# Altium footprint library Mechanical.PcbLib: 125 footprints (part 3 of 8)
Each footprint in its own frame and in the unit in brackets; x right, y up, seen from the top. Pads: shape width x height; smd on the part's side, far side on the other; paste and mask are expansions set on the pad; w line width, h text height; cw(c..) or ccw(c..) is an arc to the next point about the centre after c.
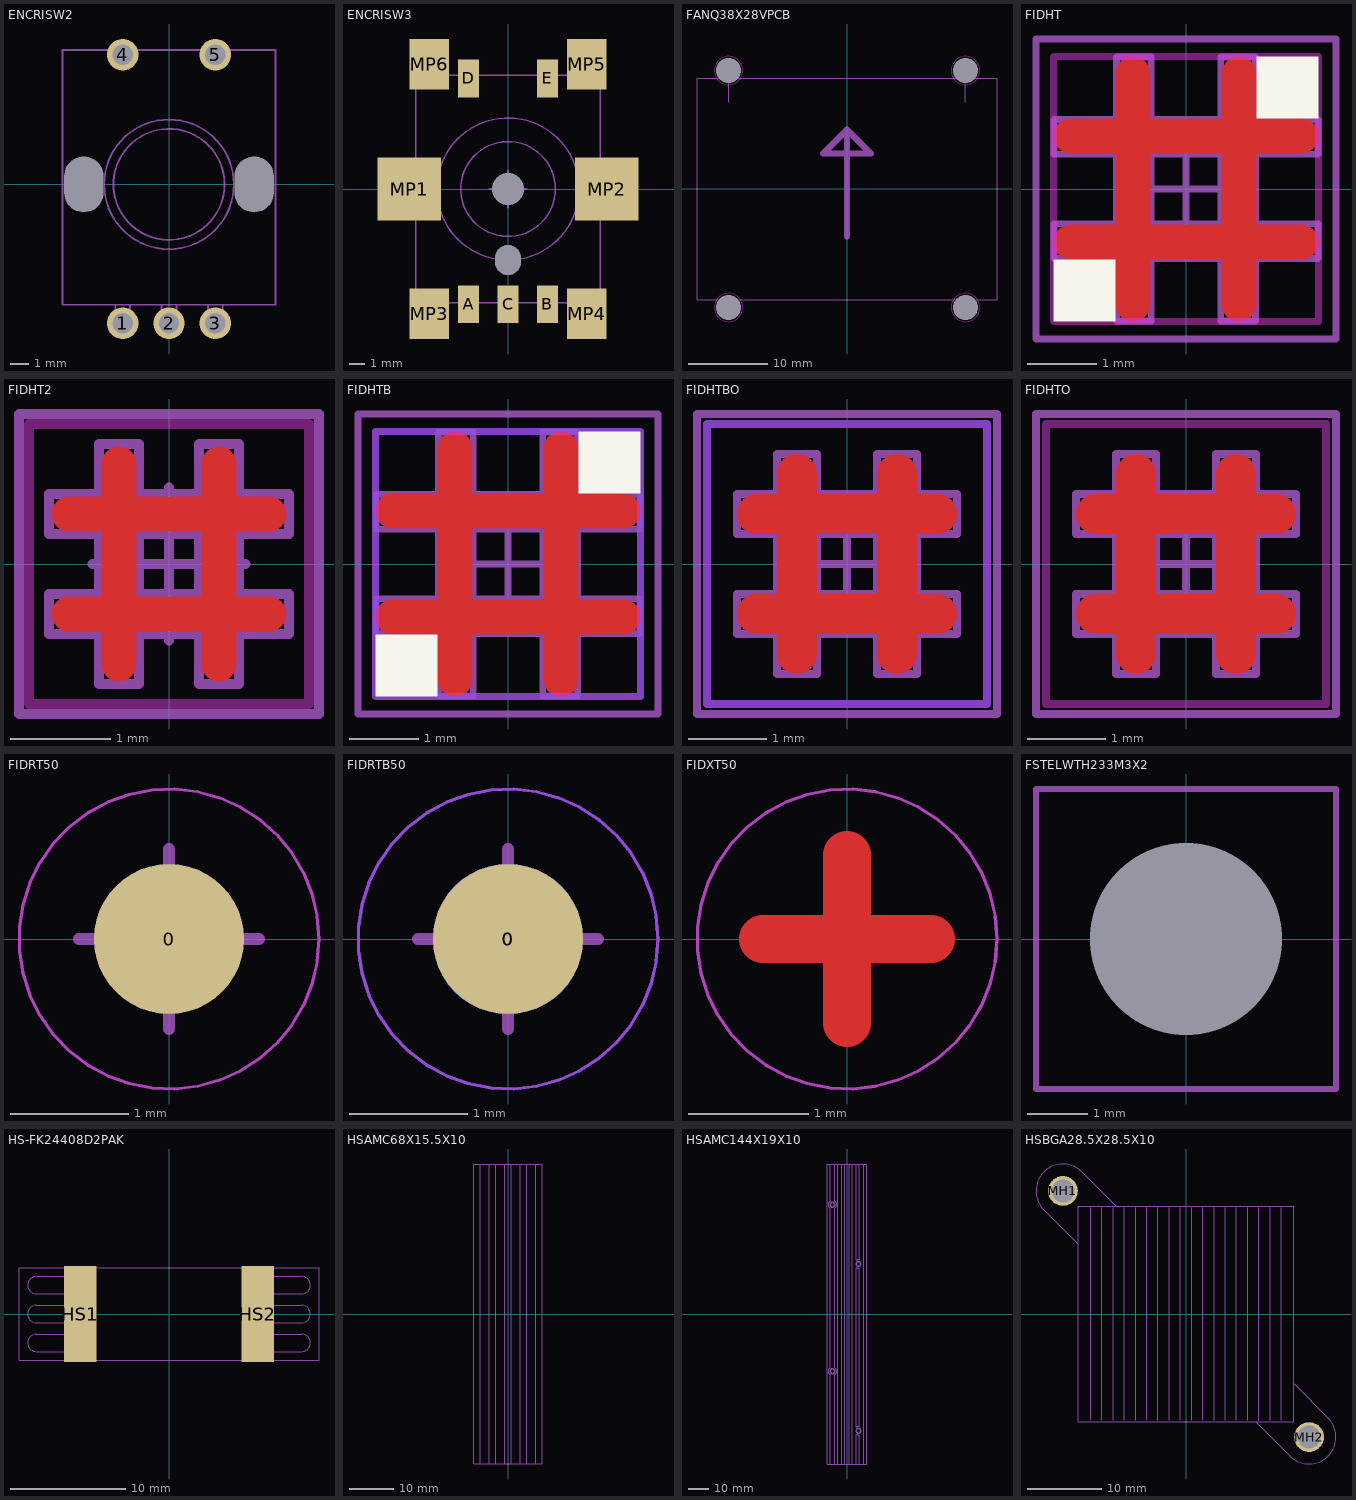
[diagram p2: the footprints below, top view; thin cyan lines are the x and y axes]

## ENCRISW2 [mm] "Incermental Encoder Type E27"
height 26
pads (7):
  round 1.7 hole 1.1: 1(-2.5,-7.5) 2(0,-7.5) 3(2.5,-7.5) 4(-2.5,7) 5(2.5,7)
  rrect50% 0x0 hole 2.1 slot 3 at 90 deg unplated: MH1(-4.6,0) MH2(4.6,0)
Mechanical 13:
  circle w0.1: c0,0 r3
  circle w0.1: c0,0 r3.5
  lines w0.1: -2.9,-6.5 -2.9,-7.5 -2.1,-7.5 -2.1,-6.5 ; -0.4,-6.5 -0.4,-7.5 0.4,-7.5 0.4,-6.5 ; 2.1,-6.5 2.1,-7.5 2.9,-7.5 2.9,-6.5 ; -5.75,-6.5 -5.75,7.25 5.725,7.25 5.75,7.25 5.75,-6.5 -5.75,-6.5
3D body: height 4, standoff 3, extent 2,-8 3,-6.5
3D body: height 4, standoff 3, extent -0.5,-8 0.5,-6.5
3D body: height 4, standoff 3, extent -3,-8 -2,-6.5
3D body: height 3, standoff -3.3, extent 2.1,6.6 2.9,7.3
3D body: height 3, standoff -3.3, extent -2.9,6.6 -2.1,7.3
3D body: height 3, standoff -3.3, extent 2.1,-7.9 2.9,-7.2
3D body: height 3, standoff -3.3, extent -0.4,-7.9 0.4,-7.2
3D body: height 3, standoff -3.3, extent -2.9,-7.9 -2.1,-7.2
3D body: height 26, standoff 10, extent -3,-3 3,3
3D body: height 10, standoff 6.3, extent -3.5,-3.5 3.5,3.5
3D body: height 6.5, standoff 0, extent -5.75,-6.5 5.725,7.25

## ENCRISW3 [mm] "Alps EC11J1524801 smd"
height 24.5
pads (13):
  rect 1.35x2.4 smd: A(-2.5,-7.3) B(2.5,-7.3) C(0,-7.3) D(-2.5,7) E(2.5,7)
  rrect50% 0x0 hole 2.05 unplated: MH1(0,0)
  rrect50% 0x0 hole 1.6 slot 1.9 at 90 deg unplated: MH2(0,-4.5)
  rect 4x4 smd: MP1(-6.25,0) MP2(6.25,0)
  rect 2.5x3.2 smd: MP3(-5,-7.9) MP4(5,-7.9) MP5(5,7.9) MP6(-5,7.9)
Mechanical 13:
  circle w0.1: c0,0 r3
  circle w0.1: c0,0 r4.5
  lines w0.1: -5.85,-1.525 -5.875,-1.5 -7.5,-1.5 -7.5,1.5 -5.85,1.5 ; -4.05,-7.2 -4.05,-9 -5.85,-9 -5.85,-7.2 ; -4.05,7.2 -4.05,9 -5.85,9 -5.85,7.2 ; 4.05,-7.2 4.05,-9 5.85,-9 5.85,-7.2 ; 4.05,7.2 4.05,9 5.85,9 5.85,7.2 ; 5.85,-1.525 5.875,-1.5 7.5,-1.5 7.5,1.5 5.85,1.5 ; -5.85,-7.2 -5.85,7.2 ; -5.85,-7.2 5.85,-7.2 ; -5.85,7.2 5.85,7.2 ; 5.85,-7.2 5.85,7.2
Mechanical 15:
  lines w0.1: -1.2,0 1.2,0 ; 0,-1.2 0,1.2
3D body: height 24.5, standoff 14.5, extent -3,-3 3,1.5
3D body: height 14.5, standoff 11.5, extent -3,-3 2.976,2.988
3D body: height 11.5, standoff 10, extent -3.5,-3.5 3.472,3.486
3D body: height 10, standoff 4.5, extent -4.5,-4.5 4.465,4.482
3D body: height 4.5, standoff 0.2, extent -5.85,-7.2 5.85,7.2
3D body: height 0.2, standoff 0, extent -7.5,-9 7.5,9

## FANQ38X28VPCB [mm] "FAN 38x38x28mm vertical mounted on pcb"
height 38
pads (4):
  round 0 hole 3.2 unplated mask+2: MH1(15,15) MH2(-15,15) MH3(-15,-15) MH4(15,-15)
Keep-Out Layer:
  circle w0.127: c15,15 r1.8
  circle w0.127: c15,-15 r1.8
  circle w0.127: c-15,-15 r1.8
  circle w0.127: c-15,15 r1.8
Mechanical 13:
  lines w0.127: -15,11 -15,14 ; 15,11 15,14 ; -19,-14 -19,14 19,14 19,-14 -19,-14
  lines w0.813: 0,-6 0,7.5 ; 0,7.5 3,4.5 -3,4.5 0,7.5
  text "FAN 38x38x28mm" at -12,-10 h3.17
3D body: height 38, standoff 36, extent -19,-14 19,14
3D body: height 2, standoff 0, extent -19,-14 19,14
3D body: height 36, standoff 2, extent 17,-14 19,14
3D body: height 36, standoff 2, extent -19,-14 -17,14

## FIDHT [mm] "Fiducial TOP hash"
Top Layer:
  lines w0.508: -1.651,-0.762 1.651,-0.762 ; -1.651,0.762 1.651,0.762 ; -0.762,-1.651 -0.762,1.651 ; 0.762,-1.651 0.762,1.651
Top Layer keep-out:
  lines w0.102: -1.905,-1.905 -1.905,1.905 1.905,1.905 1.905,-1.905 -1.905,-1.905
Top Overlay:
  rectangle: 1.016,1.016 1.905,1.905
  rectangle: -1.905,-1.905 -1.016,-1.016
Top Solder:
  rectangle: 1.016,-1.905 1.905,-1.016
  rectangle: -1.905,1.016 -1.016,1.905
Mechanical 13:
  lines w0.1: -1.9,-1 -1.9,-0.5 -1,-0.5 -1,0.5 -1.9,0.5 -1.9,1 -1,1 -1,1.9 -0.5,1.9 -0.5,1 0.5,1 0.5,1.9 1,1.9 1,1 1.9,1 1.9,0.5 1,0.5 1,-0.5 1.9,-0.5 1.9,-1 1,-1 1,-1.9 0.5,-1.9 0.5,-1 -0.5,-1 -0.5,-1.9 -1,-1.9 -1,-1 -1.9,-1 ; -0.5,-0.5 -0.5,0.5 0.5,0.5 0.5,-0.5 -0.5,-0.5
Mechanical 15:
  lines w0.102: -0.762,0 0.762,0 ; 0,-0.762 0,0.762 ; -2.159,-2.159 2.159,-2.159 2.159,2.159 -2.159,2.159 -2.159,-2.159

## FIDHT2 [mm] "Fiducial TOP hash open mask small"
Top Layer:
  lines w0.35: -1,-0.5 1,-0.5 ; -1,0.5 1,0.5 ; -0.5,-1 -0.5,1 ; 0.5,-1 0.5,1
Top Layer keep-out:
  lines w0.102: -1.4,-1.4 -1.4,1.4 1.4,1.4 1.4,-1.4 -1.4,-1.4
Mechanical 13:
  lines w0.1: -1.2,-0.7 -1.2,-0.3 -0.7,-0.3 -0.7,0.3 -1.2,0.3 -1.2,0.7 -0.7,0.7 -0.7,1.2 -0.3,1.2 -0.3,0.7 0.3,0.7 0.3,1.2 0.7,1.2 0.7,0.7 1.2,0.7 1.2,0.3 0.7,0.3 0.7,-0.3 1.2,-0.3 1.2,-0.7 0.7,-0.7 0.7,-1.2 0.3,-1.2 0.3,-0.7 -0.3,-0.7 -0.3,-1.2 -0.7,-1.2 -0.7,-0.7 -1.2,-0.7 ; -0.3,-0.3 -0.3,0.3 0.3,0.3 0.3,-0.3 -0.3,-0.3
Mechanical 15:
  lines w0.102: -0.762,0 0.762,0 ; 0,-0.762 0,0.762 ; -1.5,-1.5 1.5,-1.5 1.5,1.5 -1.5,1.5 -1.5,-1.5

## FIDHTB [mm] "Fiducial TOP & BOTTOM hash"
Top Layer:
  lines w0.508: -1.651,-0.762 1.651,-0.762 ; -1.651,0.762 1.651,0.762 ; -0.762,-1.651 -0.762,1.651 ; 0.762,-1.651 0.762,1.651
Top Layer keep-out:
  lines w0.102: -1.905,-1.905 1.905,-1.905 1.905,1.905 -1.905,1.905 -1.905,-1.905
Bottom Layer:
  lines w0.508: -1.651,-0.762 1.651,-0.762 ; -1.651,0.762 1.651,0.762 ; -0.762,-1.651 -0.762,1.651 ; 0.762,-1.651 0.762,1.651
Bottom Layer keep-out:
  lines w0.102: -1.905,-1.905 1.905,-1.905 1.905,1.905 -1.905,1.905 -1.905,-1.905
Top Overlay:
  rectangle: -1.905,-1.905 -1.016,-1.016
  rectangle: 1.016,1.016 1.905,1.905
Bottom Overlay:
  rectangle: -1.905,-1.905 -1.016,-1.016
  rectangle: 1.016,1.016 1.905,1.905
Top Solder:
  rectangle: -2.159,-2.159 2.159,2.159
Bottom Solder:
  rectangle: -2.159,-2.159 2.159,2.159
Mechanical 13:
  lines w0.1: -1.9,-1 -1,-1 -1,-1.9 -0.5,-1.9 -0.5,-1 0.5,-1 0.5,-1.9 1,-1.9 1,-1 1.9,-1 1.9,-0.5 1,-0.5 1,0.5 1.9,0.5 1.9,1 1,1 1,1.9 0.5,1.9 0.5,1 -0.5,1 -0.5,1.9 -1,1.9 -1,1 -1.9,1 -1.9,0.5 -1,0.5 -1,-0.5 -1.9,-0.5 -1.9,-1 ; -0.5,-0.5 0.5,-0.5 0.5,0.5 -0.5,0.5 -0.5,-0.5
Mechanical 14:
  lines w0.1: -1.9,-1 -1,-1 -1,-1.9 -0.5,-1.9 -0.5,-1 0.5,-1 0.5,-1.9 1,-1.9 1,-1 1.9,-1 1.9,-0.5 1,-0.5 1,0.5 1.9,0.5 1.9,1 1,1 1,1.9 0.5,1.9 0.5,1 -0.5,1 -0.5,1.9 -1,1.9 -1,1 -1.9,1 -1.9,0.5 -1,0.5 -1,-0.5 -1.9,-0.5 -1.9,-1 ; -0.5,-0.5 0.5,-0.5 0.5,0.5 -0.5,0.5 -0.5,-0.5
Mechanical 15:
  lines w0.102: -0.762,0 0.762,0 ; 0,-0.762 0,0.762 ; -2.159,-2.159 -2.159,2.159 2.159,2.159 2.159,-2.159 -2.159,-2.159
Mechanical 16:
  lines w0.102: -2.159,-2.159 -2.159,2.159 2.159,2.159 2.159,-2.159 -2.159,-2.159

## FIDHTBO [mm] "Fiducial TOP & BOTTOM hash open mask"
Top Layer:
  lines w0.508: -1.143,-0.635 1.143,-0.635 ; -1.143,0.635 1.143,0.635 ; -0.635,-1.143 -0.635,1.143 ; 0.635,-1.143 0.635,1.143
Top Layer keep-out:
  lines w0.102: -1.778,-1.778 -1.778,1.778 1.778,1.778 1.778,-1.778 -1.778,-1.778
Bottom Layer:
  lines w0.508: -1.143,-0.635 1.143,-0.635 ; -1.143,0.635 1.143,0.635 ; -0.635,-1.143 -0.635,1.143 ; 0.635,-1.143 0.635,1.143
Bottom Layer keep-out:
  lines w0.102: -1.778,-1.778 -1.778,1.778 1.778,1.778 1.778,-1.778 -1.778,-1.778
Top Solder:
  rectangle: -1.905,-1.905 1.905,1.905
Bottom Solder:
  rectangle: -1.905,-1.905 1.905,1.905
Mechanical 13:
  lines w0.1: -1.397,-0.889 -1.397,-0.381 -0.889,-0.381 -0.889,0.381 -1.397,0.381 -1.397,0.889 -0.889,0.889 -0.889,1.397 -0.381,1.397 -0.381,0.889 0.381,0.889 0.381,1.397 0.889,1.397 0.889,0.889 1.397,0.889 1.397,0.381 0.889,0.381 0.889,-0.381 1.397,-0.381 1.397,-0.889 0.889,-0.889 0.889,-1.397 0.381,-1.397 0.381,-0.889 -0.381,-0.889 -0.381,-1.397 -0.889,-1.397 -0.889,-0.889 -1.397,-0.889 ; -0.381,-0.381 -0.381,0.381 0.381,0.381 0.381,-0.381 -0.381,-0.381
Mechanical 14:
  lines w0.1: -1.397,-0.889 -1.397,-0.381 -0.889,-0.381 -0.889,0.381 -1.397,0.381 -1.397,0.889 -0.889,0.889 -0.889,1.397 -0.381,1.397 -0.381,0.889 0.381,0.889 0.381,1.397 0.889,1.397 0.889,0.889 1.397,0.889 1.397,0.381 0.889,0.381 0.889,-0.381 1.397,-0.381 1.397,-0.889 0.889,-0.889 0.889,-1.397 0.381,-1.397 0.381,-0.889 -0.381,-0.889 -0.381,-1.397 -0.889,-1.397 -0.889,-0.889 -1.397,-0.889 ; -0.381,-0.381 -0.381,0.381 0.381,0.381 0.381,-0.381 -0.381,-0.381
Mechanical 15:
  lines w0.102: -0.762,0 0.762,0 ; 0,-0.762 0,0.762 ; -1.905,-1.905 1.905,-1.905 1.905,1.905 -1.905,1.905 -1.905,-1.905

## FIDHTO [mm] "Fiducial TOP hash open mask"
Top Layer:
  lines w0.508: -1.143,-0.635 1.143,-0.635 ; -1.143,0.635 1.143,0.635 ; -0.635,-1.143 -0.635,1.143 ; 0.635,-1.143 0.635,1.143
Top Layer keep-out:
  lines w0.102: -1.778,-1.778 1.778,-1.778 1.778,1.778 -1.778,1.778 -1.778,-1.778
Top Solder:
  rectangle: -1.905,-1.905 1.905,1.905
Mechanical 13:
  lines w0.1: -1.397,-0.889 -0.889,-0.889 -0.889,-1.397 -0.381,-1.397 -0.381,-0.889 0.381,-0.889 0.381,-1.397 0.889,-1.397 0.889,-0.889 1.397,-0.889 1.397,-0.381 0.889,-0.381 0.889,0.381 1.397,0.381 1.397,0.889 0.889,0.889 0.889,1.397 0.381,1.397 0.381,0.889 -0.381,0.889 -0.381,1.397 -0.889,1.397 -0.889,0.889 -1.397,0.889 -1.397,0.381 -0.889,0.381 -0.889,-0.381 -1.397,-0.381 -1.397,-0.889 ; -0.381,-0.381 0.381,-0.381 0.381,0.381 -0.381,0.381 -0.381,-0.381
Mechanical 15:
  lines w0.102: -0.762,0 0.762,0 ; 0,-0.762 0,0.762 ; -1.905,-1.905 -1.905,1.905 1.905,1.905 1.905,-1.905 -1.905,-1.905

## FIDRT50 [mm] "Fiducial TOP round 50mil"
pads (1):
  round 1.27 smd paste-2.54 mask+0.635: 0(0,0)
Top Layer keep-out:
  circle w0.025: c0,0 r1.27
Mechanical 13:
  circle w0.025: c0,0 r1.27
Mechanical 15:
  lines w0.102: -0.762,0 0.762,0 ; 0,-0.762 0,0.762

## FIDRTB50 [mm] "Fiducial Top & Bottom round 50mil"
pads (2):
  round 1.27 smd paste-2.54 mask+0.635: 0(0,0)
  round 1.27 smd far side paste-2.54 mask+0.635: 0(0,0)
Top Layer keep-out:
  circle w0.025: c0,0 r1.27
Bottom Layer keep-out:
  circle w0.025: c0,0 r1.27
Mechanical 13:
  circle w0.025: c0,0 r1.27
Mechanical 14:
  circle w0.025: c0,0 r1.27
Mechanical 15:
  lines w0.102: -0.762,0 0.762,0 ; 0,-0.762 0,0.762

## FIDXT50 [mm] "Fiducial TOP cross 50mil"
Top Layer:
  lines w0.4: -0.7,0 0.7,0 ; 0,-0.7 0,0.7
Top Layer keep-out:
  circle w0.025: c0,0 r1.25
Top Solder:
  circle w1.2: c0,0 r0.625
Mechanical 13:
  circle w0.025: c0,0 r1.25
Mechanical 15:
  lines w0.102: -0.762,0 0.762,0 ; 0,-0.762 0,0.762

## FSTELWTH233M3X2 [mm] "Fastening element with thread 233 M3"
height 9
pads (1):
  round 0 hole 3.2 unplated mask+2: MH0(0,0)
Mechanical 13:
  lines w0.102: -2.5,-2.5 -2.5,2.5 2.5,2.5 2.5,-2.5 -2.5,-2.5
3D body: height 9, standoff 0, extent -2.5,-2.5 2.5,2.5

## HS-FK24408D2PAK [mm] "Heatsink DPAK 26x8x10mm R17.8mm"
height 10
pads (2):
  rect 2.8x8.3 smd mask+0.254: HS1(-7.7,0) HS2(7.7,0)
Mechanical 13:
  lines w0.102: -7,-4 -7,4 ; -6.5,-4 -6.5,4 ; 6.5,4 6.5,-4 7,-4 7,4 ; -13,-4 13,-4 13,4 -13,4 -13,-4 ; -11.5,-3.25 cw(c-11.5,-2.5) -11.5,-1.75 -8.15,-1.75 cw(c-8.15,-2.5) -8.15,-3.25 -11.5,-3.25 ; -11.5,-0.75 cw(c-11.5,0) -11.5,0.75 -8.15,0.75 cw(c-8.15,0) -8.15,-0.75 -11.5,-0.75 ; -11.5,1.75 cw(c-11.5,2.5) -11.5,3.25 -8.15,3.25 cw(c-8.15,2.5) -8.15,1.75 -11.5,1.75 ; 8.15,-3.25 cw(c8.15,-2.5) 8.15,-1.75 11.5,-1.75 cw(c11.5,-2.5) 11.5,-3.25 8.15,-3.25 ; 8.15,-0.75 cw(c8.15,0) 8.15,0.75 11.5,0.75 cw(c11.5,0) 11.5,-0.75 8.15,-0.75 ; 8.15,1.75 cw(c8.15,2.5) 8.15,3.25 11.5,3.25 cw(c11.5,2.5) 11.5,1.75 8.15,1.75
3D body: height 10, standoff 8.4, extent -13,-4 -6.75,4
3D body: height 8.6, standoff 8, extent -7.1,-4 7.1,4
3D body: height 8, standoff 0.6, extent -7.1,-4 -6.5,4
3D body: height 0.6, standoff 0, extent -8.9,-4 -6.5,4
3D body: height 0.6, standoff 0, extent 6.5,-4 8.9,4
3D body: height 8, standoff 0.6, extent 6.5,-4 7.1,4
3D body: height 10, standoff 8.4, extent 6.75,-4 13,4

## HSAMC68X15.5X10 [mm] "Heatsink AMC 68x15.5x10mm Al profile"
height 10
Mechanical 13:
  lines w0.102: -6.25,-34 -6.25,34 ; -4.25,-34 -4.25,34 ; -2.75,-34 -2.75,34 ; -0.75,-34 -0.75,34 ; 0.75,-34 0.75,34 ; 2.75,-34 2.75,34 ; 4.25,-34 4.25,34 ; 6.25,-34 6.25,34 ; -7.75,-34 -7.75,34 7.75,34 7.75,-34 -7.75,-34
3D body: height 13, standoff 3, extent -7.75,-34 7.75,34

## HSAMC144X19X10 [mm] "Heatsink AMC 144x19x10mm Al profile"
height 10
Mechanical 13:
  circle w0.102: c-7,52.5 r1.25
  circle w0.102: c5.5,24 r1.25
  circle w0.102: c-7,-27.5 r1
  circle w0.102: c-7,-27.5 r1.25
  circle w0.102: c5.5,-56 r1
  circle w0.102: c5.5,-56 r1.25
  circle w0.102: c-7,52.5 r1
  circle w0.102: c5.5,24 r1
  lines w0.102: -8.003,-29.23 cw(c-7,-27.5) -8.003,-25.77 ; -8.003,50.77 cw(c-7,52.5) -8.003,54.23 ; -8,-72 -8,-29.23 ; -8,-25.77 -8,50.77 ; -8,54.23 -8,72 ; -6,-72 -6,-29.23 ; -6,-25.77 -6,50.753 -5.963,50.79 ccw(c-7,52.5) -5.997,54.23 ; -6,54.23 -6,72 ; -5.997,-29.23 ccw(c-7,-27.5) -5.997,-25.77 ; -4.5,-72 -4.5,72 ; -2.5,-72 -2.5,72 ; -1,-72 -1,72 ; 1,-72 1,72 ; 2.5,-72 2.5,72 ; 4.5,-72 4.5,-57.736 ; 4.5,-54.264 4.5,22.264 ; 4.5,25.736 4.5,72 ; 4.508,-57.736 ccw(c5.5,-56) 5.997,-57.937 ; 4.508,-54.264 cw(c5.5,-56) 5.997,-54.063 ; 4.508,22.264 ccw(c5.5,24) 5.997,22.063 ; 4.508,25.736 cw(c5.5,24) 6.003,25.936 ; 6,-72 6,-57.937 ; 6,-54.05 6,22.063 ; 6,25.936 6,72 ; 8,-72 8,72 ; -9.5,-72 -9.5,72 9.5,72 9.5,-72 -9.5,-72
3D body: height 10, standoff 4, extent -6,-72 -4.5,72
3D body: height 10, standoff 4, extent -2.5,-72 -1,72
3D body: height 10, standoff 4, extent 1,-72 2.5,72
3D body: height 10, standoff 4, extent 4.5,-72 6,-57.736
3D body: height 10, standoff 4, extent 8,-72 9.5,72
3D body: height 10, standoff 4, extent 4.5,25.736 6,72
3D body: height 10, standoff 4, extent 4.5,-54.264 6,22.264
3D body: height 10, standoff 4, extent -9.5,-72 -8,72
3D body: height 4, standoff 0, extent -9.5,-72 9.5,72

## HSBGA28.5X28.5X10 [mm] "Heatsink BGA 28.5x28.5x10mm with push pins"
height 10
pads (2):
  round 4 hole 3.1 mask+0.254: MH1(-16.475,16.475) MH2(16.475,-16.475)
Mechanical 13:
  circle w0.104: c16.475,-16.475 r1.5
  circle w0.104: c-16.475,16.5 r1.5
  lines w0.102: -19.021,13.929 -14.446,9.354 ; -13.929,19.021 -9.354,14.446 ; -12.75,-14.25 -12.75,14.25 ; -11.25,-14.25 -11.25,14.25 ; -9.75,-14.25 -9.75,14.25 ; -8.25,-14.25 -8.25,14.25 ; -6.75,-14.25 -6.75,14.25 ; -5.25,-14.25 -5.25,14.25 ; -3.75,-14.25 -3.75,14.25 ; -2.25,-14.25 -2.25,14.25 ; -0.75,-14.25 -0.75,14.25 ; 0.75,-14.25 0.75,14.25 ; 2.25,-14.25 2.25,14.25 ; 3.75,-14.25 3.75,14.25 ; 5.25,-14.25 5.25,14.25 ; 6.75,-14.25 6.75,14.25 ; 8.25,-14.25 8.25,14.25 ; 9.354,-14.446 13.929,-19.021 ; 9.75,-14.25 9.75,14.25 ; 11.25,-14.25 11.25,14.25 ; 12.75,-14.25 12.75,14.25 ; 14.458,-9.367 19.021,-13.929 ; -14.45,-14.45 -14.45,14.45 14.45,14.45 14.45,-14.45 -14.45,-14.45
  lines w0.104: -19.021,13.929 cw(c-16.475,16.475) -13.929,19.021 ; 13.929,-19.021 ccw(c16.475,-16.475) 19.021,-13.929
Mechanical 15:
  text "Dvigni po potrebi!" at -9.075,15.525 h1.52
3D body: height 12, standoff 2, extent -20.57,-20.57 20.571,20.571